# Altium schematic symbol library SCHLIB.SchLib: 2608 symbols (part 15 of 20)
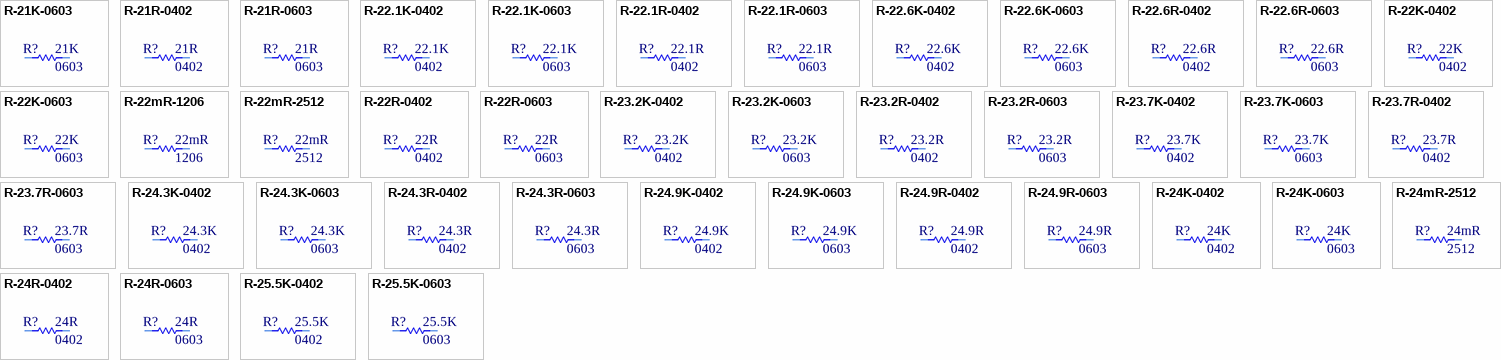
[diagram p97: symbols R-21K-0603 to R-25.5K-0603]

## R-22K-0603
designator R?, comment Package: 0603  (hidden comment: 22K)
RES SMD 22K OHM 1% 1/10W 0603; Manufacturer Part Number: CRCW060322K0FKEA; Manufacturer: Vishay Dale; Tolerance: 0.01; Power: 0.1W; Temperature Coefficient: ±100ppm/°C; Object  Type: Part; Design Item ID: R-22K-0603; Value: 22K; Composition: Thick Film; Features: Automotive AEC-Q200; Operating Temperature: -55°C ~ 155°C; Height - Seated (Max): 0.50mm; Category: Resistor
footprint R0603
pins: 1, 2

## R-22mR-1206
designator R?, comment Package: 1206  (hidden comment: 22mR)
RES 0.022 OHM 1% 1/4W 1206; Manufacturer Part Number: WSL1206R0220FEA; Manufacturer: Vishay Dale; Tolerance: 0.01; Power: 0.25W; Temperature Coefficient: ±75ppm/°C; Object  Type: Part; Design Item ID: R-22mR-1206; Value: 22mR; Composition: Metal Element; Features: Anti-Sulfur, Automotive AEC-Q200, Current Sense, Moisture Resistant, Pulse Withstanding; Operating Temperature: -65°C ~ 170°C; Height - Seated (Max): 0.89mm; Category: Resistor
footprint R1206
pins: 1, 2

## R-22mR-2512
designator R?, comment Package: 2512  (hidden comment: 22mR)
RES 0.022 OHM 1% 1W 2512; Manufacturer Part Number: WSL2512R0220FEA; Manufacturer: Vishay Dale; Tolerance: 0.01; Temperature Coefficient: ±75ppm/°C; Object  Type: Part; Design Item ID: R-22mR-2512; Value: 22mR; Power: 1W; Composition: Metal Element; Features: Anti-Sulfur, Automotive AEC-Q200, Current Sense, Moisture Resistant, Pulse Withstanding; Operating Temperature: -65°C ~ 170°C; Height - Seated (Max): 0.89mm; Category: Resistor
footprint R2512
pins: 1, 2

## R-22R-0402
designator R?, comment Package: 0402  (hidden comment: 22R)
RES 22 OHM 1% 1/16W 0402; Manufacturer Part Number: RC0402FR-0722RL; Manufacturer: YAGEO; Tolerance: 0.01; Power: 0.063W; Temperature Coefficient: ±100ppm/°C; Object  Type: Part; Design Item ID: R-22R-0402; Value: 22R; Composition: Thick Film; Features: Moisture Resistant; Operating Temperature: -55°C ~ 155°C; Height - Seated (Max): 0.40mm; Category: Resistor
footprint R0402
pins: 1, 2

## R-22R-0603
designator R?, comment Package: 0603  (hidden comment: 22R)
RES SMD 22 OHM 1% 1/10W 0603; Manufacturer Part Number: CRCW060322R0FKEA; Manufacturer: Vishay Dale; Tolerance: 0.01; Power: 0.1W; Temperature Coefficient: ±100ppm/°C; Object  Type: Part; Design Item ID: R-22R-0603; Value: 22R; Composition: Thick Film; Features: Automotive AEC-Q200; Operating Temperature: -55°C ~ 155°C; Height - Seated (Max): 0.50mm; Category: Resistor
footprint R0603
pins: 1, 2

## R-23.2K-0402
designator R?, comment Package: 0402  (hidden comment: 23.2K)
RES 23.2K OHM 1% 1/16W 0402; Manufacturer Part Number: RC0402FR-0723K2L; Manufacturer: YAGEO; Tolerance: 0.01; Power: 0.063W; Temperature Coefficient: ±100ppm/°C; Object  Type: Part; Design Item ID: R-23.2K-0402; Value: 23.2K; Composition: Thick Film; Features: Moisture Resistant; Operating Temperature: -55°C ~ 155°C; Height - Seated (Max): 0.40mm; Category: Resistor
footprint R0402
pins: 1, 2

## R-23.2K-0603
designator R?, comment Package: 0603  (hidden comment: 23.2K)
RES SMD 23.2K OHM 1% 1/10W 0603; Manufacturer Part Number: CRCW060323K2FKEA; Manufacturer: Vishay Dale; Tolerance: 0.01; Power: 0.1W; Temperature Coefficient: ±100ppm/°C; Object  Type: Part; Design Item ID: R-23.2K-0603; Value: 23.2K; Composition: Thick Film; Features: Automotive AEC-Q200; Operating Temperature: -55°C ~ 155°C; Height - Seated (Max): 0.50mm; Category: Resistor
footprint R0603
pins: 1, 2

## R-23.2R-0402
designator R?, comment Package: 0402  (hidden comment: 23.2R)
RES 23.2 OHM 1% 1/16W 0402; Manufacturer Part Number: RC0402FR-0723R2L; Manufacturer: YAGEO; Tolerance: 0.01; Power: 0.063W; Temperature Coefficient: ±100ppm/°C; Object  Type: Part; Design Item ID: R-23.2R-0402; Value: 23.2R; Composition: Thick Film; Features: Moisture Resistant; Operating Temperature: -55°C ~ 155°C; Height - Seated (Max): 0.40mm; Category: Resistor
footprint R0402
pins: 1, 2

## R-23.2R-0603
designator R?, comment Package: 0603  (hidden comment: 23.2R)
RES SMD 23.2 OHM 1% 1/10W 0603; Manufacturer Part Number: CRCW060323R2FKEA; Manufacturer: Vishay Dale; Tolerance: 0.01; Power: 0.1W; Temperature Coefficient: ±100ppm/°C; Object  Type: Part; Design Item ID: R-23.2R-0603; Value: 23.2R; Composition: Thick Film; Features: Automotive AEC-Q200; Operating Temperature: -55°C ~ 155°C; Height - Seated (Max): 0.50mm; Category: Resistor
footprint R0603
pins: 1, 2

## R-23.7K-0402
designator R?, comment Package: 0402  (hidden comment: 23.7K)
RES 23.7K OHM 1% 1/16W 0402; Manufacturer Part Number: RC0402FR-0723K7L; Manufacturer: YAGEO; Tolerance: 0.01; Power: 0.063W; Temperature Coefficient: ±100ppm/°C; Object  Type: Part; Design Item ID: R-23.7K-0402; Value: 23.7K; Composition: Thick Film; Features: Moisture Resistant; Operating Temperature: -55°C ~ 155°C; Height - Seated (Max): 0.40mm; Category: Resistor
footprint R0402
pins: 1, 2

## R-23.7K-0603
designator R?, comment Package: 0603  (hidden comment: 23.7K)
RES SMD 23.7K OHM 1% 1/10W 0603; Manufacturer Part Number: CRCW060323K7FKEA; Manufacturer: Vishay Dale; Tolerance: 0.01; Power: 0.1W; Temperature Coefficient: ±100ppm/°C; Object  Type: Part; Design Item ID: R-23.7K-0603; Value: 23.7K; Composition: Thick Film; Features: Automotive AEC-Q200; Operating Temperature: -55°C ~ 155°C; Height - Seated (Max): 0.50mm; Category: Resistor
footprint R0603
pins: 1, 2

## R-23.7R-0402
designator R?, comment Package: 0402  (hidden comment: 23.7R)
RES 23.7 OHM 1% 1/16W 0402; Manufacturer Part Number: RC0402FR-0723R7L; Manufacturer: YAGEO; Tolerance: 0.01; Power: 0.063W; Temperature Coefficient: ±100ppm/°C; Object  Type: Part; Design Item ID: R-23.7R-0402; Value: 23.7R; Composition: Thick Film; Features: Moisture Resistant; Operating Temperature: -55°C ~ 155°C; Height - Seated (Max): 0.40mm; Category: Resistor
footprint R0402
pins: 1, 2

## R-23.7R-0603
designator R?, comment Package: 0603  (hidden comment: 23.7R)
RES SMD 23.7 OHM 1% 1/10W 0603; Manufacturer Part Number: CRCW060323R7FKEA; Manufacturer: Vishay Dale; Tolerance: 0.01; Power: 0.1W; Temperature Coefficient: ±100ppm/°C; Object  Type: Part; Design Item ID: R-23.7R-0603; Value: 23.7R; Composition: Thick Film; Features: Automotive AEC-Q200; Operating Temperature: -55°C ~ 155°C; Height - Seated (Max): 0.50mm; Category: Resistor
footprint R0603
pins: 1, 2

## R-24.3K-0402
designator R?, comment Package: 0402  (hidden comment: 24.3K)
RES 24.3K OHM 1% 1/16W 0402; Manufacturer Part Number: RC0402FR-0724K3L; Manufacturer: YAGEO; Tolerance: 0.01; Power: 0.063W; Temperature Coefficient: ±100ppm/°C; Object  Type: Part; Design Item ID: R-24.3K-0402; Value: 24.3K; Composition: Thick Film; Features: Moisture Resistant; Operating Temperature: -55°C ~ 155°C; Height - Seated (Max): 0.40mm; Category: Resistor
footprint R0402
pins: 1, 2

## R-24.3K-0603
designator R?, comment Package: 0603  (hidden comment: 24.3K)
RES SMD 24.3K OHM 1% 1/10W 0603; Manufacturer Part Number: CRCW060324K3FKEA; Manufacturer: Vishay Dale; Tolerance: 0.01; Power: 0.1W; Temperature Coefficient: ±100ppm/°C; Object  Type: Part; Design Item ID: R-24.3K-0603; Value: 24.3K; Composition: Thick Film; Features: Automotive AEC-Q200; Operating Temperature: -55°C ~ 155°C; Height - Seated (Max): 0.50mm; Category: Resistor
footprint R0603
pins: 1, 2

## R-24.3R-0402
designator R?, comment Package: 0402  (hidden comment: 24.3R)
RES 24.3 OHM 1% 1/16W 0402; Manufacturer Part Number: RC0402FR-0724R3L; Manufacturer: YAGEO; Tolerance: 0.01; Power: 0.063W; Temperature Coefficient: ±100ppm/°C; Object  Type: Part; Design Item ID: R-24.3R-0402; Value: 24.3R; Composition: Thick Film; Features: Moisture Resistant; Operating Temperature: -55°C ~ 155°C; Height - Seated (Max): 0.40mm; Category: Resistor
footprint R0402
pins: 1, 2

## R-24.3R-0603
designator R?, comment Package: 0603  (hidden comment: 24.3R)
RES SMD 24.3 OHM 1% 1/10W 0603; Manufacturer Part Number: CRCW060324R3FKEA; Manufacturer: Vishay Dale; Tolerance: 0.01; Power: 0.1W; Temperature Coefficient: ±100ppm/°C; Object  Type: Part; Design Item ID: R-24.3R-0603; Value: 24.3R; Composition: Thick Film; Features: Automotive AEC-Q200; Operating Temperature: -55°C ~ 155°C; Height - Seated (Max): 0.50mm; Category: Resistor
footprint R0603
pins: 1, 2

## R-24.9K-0402
designator R?, comment Package: 0402  (hidden comment: 24.9K)
RES 24.9K OHM 1% 1/16W 0402; Manufacturer Part Number: RC0402FR-0724K9L; Manufacturer: YAGEO; Tolerance: 0.01; Power: 0.063W; Temperature Coefficient: ±100ppm/°C; Object  Type: Part; Design Item ID: R-24.9K-0402; Value: 24.9K; Composition: Thick Film; Features: Moisture Resistant; Operating Temperature: -55°C ~ 155°C; Height - Seated (Max): 0.40mm; Category: Resistor
footprint R0402
pins: 1, 2

## R-24.9K-0603
designator R?, comment Package: 0603  (hidden comment: 24.9K)
RES SMD 24.9K OHM 1% 1/10W 0603; Manufacturer Part Number: CRCW060324K9FKEA; Manufacturer: Vishay Dale; Tolerance: 0.01; Power: 0.1W; Temperature Coefficient: ±100ppm/°C; Object  Type: Part; Design Item ID: R-24.9K-0603; Value: 24.9K; Composition: Thick Film; Features: Automotive AEC-Q200; Operating Temperature: -55°C ~ 155°C; Height - Seated (Max): 0.50mm; Category: Resistor
footprint R0603
pins: 1, 2

## R-24.9R-0402
designator R?, comment Package: 0402  (hidden comment: 24.9R)
RES 24.9 OHM 1% 1/16W 0402; Manufacturer Part Number: RC0402FR-0724R9L; Manufacturer: YAGEO; Tolerance: 0.01; Power: 0.063W; Temperature Coefficient: ±100ppm/°C; Object  Type: Part; Design Item ID: R-24.9R-0402; Value: 24.9R; Composition: Thick Film; Features: Moisture Resistant; Operating Temperature: -55°C ~ 155°C; Height - Seated (Max): 0.40mm; Category: Resistor
footprint R0402
pins: 1, 2

## R-24.9R-0603
designator R?, comment Package: 0603  (hidden comment: 24.9R)
RES SMD 24.9 OHM 1% 1/10W 0603; Manufacturer Part Number: CRCW060324R9FKEA; Manufacturer: Vishay Dale; Tolerance: 0.01; Power: 0.1W; Temperature Coefficient: ±100ppm/°C; Object  Type: Part; Design Item ID: R-24.9R-0603; Value: 24.9R; Composition: Thick Film; Features: Automotive AEC-Q200; Operating Temperature: -55°C ~ 155°C; Height - Seated (Max): 0.50mm; Category: Resistor
footprint R0603
pins: 1, 2

## R-24K-0402
designator R?, comment Package: 0402  (hidden comment: 24K)
RES 24K OHM 1% 1/16W 0402; Manufacturer Part Number: RC0402FR-0724KL; Manufacturer: YAGEO; Tolerance: 0.01; Power: 0.063W; Temperature Coefficient: ±100ppm/°C; Object  Type: Part; Design Item ID: R-24K-0402; Value: 24K; Composition: Thick Film; Features: Moisture Resistant; Operating Temperature: -55°C ~ 155°C; Height - Seated (Max): 0.40mm; Category: Resistor
footprint R0402
pins: 1, 2

## R-24K-0603
designator R?, comment Package: 0603  (hidden comment: 24K)
RES SMD 24K OHM 1% 1/10W 0603; Manufacturer Part Number: CRCW060324K0FKEA; Manufacturer: Vishay Dale; Tolerance: 0.01; Power: 0.1W; Temperature Coefficient: ±100ppm/°C; Object  Type: Part; Design Item ID: R-24K-0603; Value: 24K; Composition: Thick Film; Features: Automotive AEC-Q200; Operating Temperature: -55°C ~ 155°C; Height - Seated (Max): 0.50mm; Category: Resistor
footprint R0603
pins: 1, 2

## R-24mR-2512
designator R?, comment Package: 2512  (hidden comment: 24mR)
RES 0.024 OHM 1% 1W 2512; Manufacturer Part Number: WSL2512R0240FEA; Manufacturer: Vishay Dale; Tolerance: 0.01; Temperature Coefficient: ±75ppm/°C; Object  Type: Part; Design Item ID: R-24mR-2512; Value: 24mR; Power: 1W; Composition: Metal Element; Features: Anti-Sulfur, Automotive AEC-Q200, Current Sense, Moisture Resistant, Pulse Withstanding; Operating Temperature: -65°C ~ 170°C; Height - Seated (Max): 0.89mm; Category: Resistor
footprint R2512
pins: 1, 2

## R-24R-0402
designator R?, comment Package: 0402  (hidden comment: 24R)
RES 24 OHM 1% 1/16W 0402; Manufacturer Part Number: RC0402FR-0724RL; Manufacturer: YAGEO; Tolerance: 0.01; Power: 0.063W; Temperature Coefficient: ±100ppm/°C; Object  Type: Part; Design Item ID: R-24R-0402; Value: 24R; Composition: Thick Film; Features: Moisture Resistant; Operating Temperature: -55°C ~ 155°C; Height - Seated (Max): 0.40mm; Category: Resistor
footprint R0402
pins: 1, 2

## R-24R-0603
designator R?, comment Package: 0603  (hidden comment: 24R)
RES SMD 24 OHM 1% 1/10W 0603; Manufacturer Part Number: CRCW060324R0FKEA; Manufacturer: Vishay Dale; Tolerance: 0.01; Power: 0.1W; Temperature Coefficient: ±100ppm/°C; Object  Type: Part; Design Item ID: R-24R-0603; Value: 24R; Composition: Thick Film; Features: Automotive AEC-Q200; Operating Temperature: -55°C ~ 155°C; Height - Seated (Max): 0.50mm; Category: Resistor
footprint R0603
pins: 1, 2

## R-25.5K-0402
designator R?, comment Package: 0402  (hidden comment: 25.5K)
RES 25.5K OHM 1% 1/16W 0402; Manufacturer Part Number: RC0402FR-0725K5L; Manufacturer: YAGEO; Tolerance: 0.01; Power: 0.063W; Temperature Coefficient: ±100ppm/°C; Object  Type: Part; Design Item ID: R-25.5K-0402; Value: 25.5K; Composition: Thick Film; Features: Moisture Resistant; Operating Temperature: -55°C ~ 155°C; Height - Seated (Max): 0.40mm; Category: Resistor
footprint R0402
pins: 1, 2

## R-25.5K-0603
designator R?, comment Package: 0603  (hidden comment: 25.5K)
RES SMD 25.5K OHM 1% 1/10W 0603; Manufacturer Part Number: CRCW060325K5FKEA; Manufacturer: Vishay Dale; Tolerance: 0.01; Power: 0.1W; Temperature Coefficient: ±100ppm/°C; Object  Type: Part; Design Item ID: R-25.5K-0603; Value: 25.5K; Composition: Thick Film; Features: Automotive AEC-Q200; Operating Temperature: -55°C ~ 155°C; Height - Seated (Max): 0.50mm; Category: Resistor
footprint R0603
pins: 1, 2

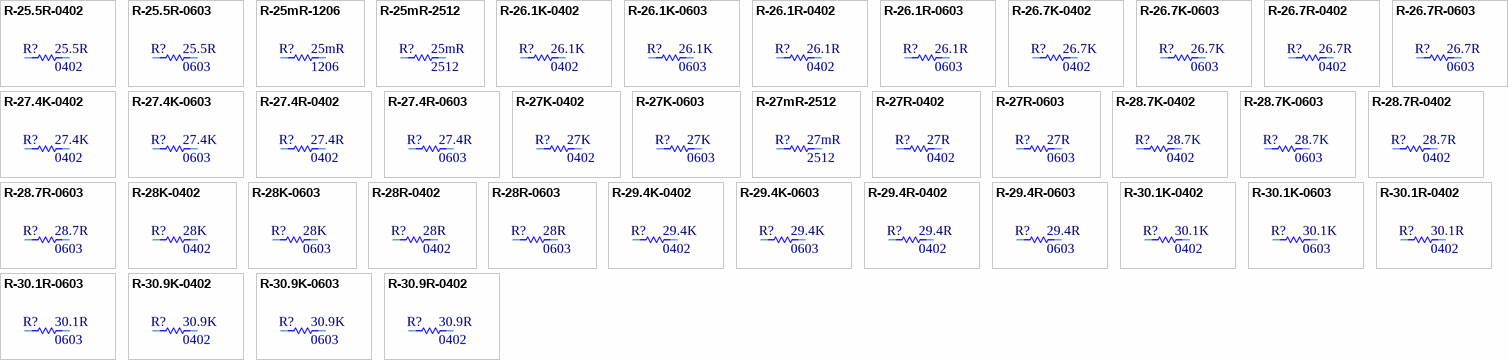
[diagram p62: symbols R-25.5R-0402 to R-30.9R-0402]

## R-25.5R-0402
designator R?, comment Package: 0402  (hidden comment: 25.5R)
RES 25.5 OHM 1% 1/16W 0402; Manufacturer Part Number: RC0402FR-0725R5L; Manufacturer: YAGEO; Tolerance: 0.01; Power: 0.063W; Temperature Coefficient: ±100ppm/°C; Object  Type: Part; Design Item ID: R-25.5R-0402; Value: 25.5R; Composition: Thick Film; Features: Moisture Resistant; Operating Temperature: -55°C ~ 155°C; Height - Seated (Max): 0.40mm; Category: Resistor
footprint R0402
pins: 1, 2

## R-25.5R-0603
designator R?, comment Package: 0603  (hidden comment: 25.5R)
RES SMD 25.5 OHM 1% 1/10W 0603; Manufacturer Part Number: CRCW060325R5FKEA; Manufacturer: Vishay Dale; Tolerance: 0.01; Power: 0.1W; Temperature Coefficient: ±100ppm/°C; Object  Type: Part; Design Item ID: R-25.5R-0603; Value: 25.5R; Composition: Thick Film; Features: Automotive AEC-Q200; Operating Temperature: -55°C ~ 155°C; Height - Seated (Max): 0.50mm; Category: Resistor
footprint R0603
pins: 1, 2

## R-25mR-1206
designator R?, comment Package: 1206  (hidden comment: 25mR)
RES 0.025 OHM 1% 1/4W 1206; Manufacturer Part Number: WSL1206R0250FEA; Manufacturer: Vishay Dale; Tolerance: 0.01; Power: 0.25W; Temperature Coefficient: ±75ppm/°C; Object  Type: Part; Design Item ID: R-25mR-1206; Value: 25mR; Composition: Metal Element; Features: Anti-Sulfur, Automotive AEC-Q200, Current Sense, Moisture Resistant, Pulse Withstanding; Operating Temperature: -65°C ~ 170°C; Height - Seated (Max): 0.89mm; Category: Resistor
footprint R1206
pins: 1, 2

## R-25mR-2512
designator R?, comment Package: 2512  (hidden comment: 25mR)
RES 0.025 OHM 1% 1W 2512; Manufacturer Part Number: WSL2512R0250FEA; Manufacturer: Vishay Dale; Tolerance: 0.01; Temperature Coefficient: ±75ppm/°C; Object  Type: Part; Design Item ID: R-25mR-2512; Value: 25mR; Power: 1W; Composition: Metal Element; Features: Anti-Sulfur, Automotive AEC-Q200, Current Sense, Moisture Resistant, Pulse Withstanding; Operating Temperature: -65°C ~ 170°C; Height - Seated (Max): 0.89mm; Category: Resistor
footprint R2512
pins: 1, 2

## R-26.1K-0402
designator R?, comment Package: 0402  (hidden comment: 26.1K)
RES 26.1K OHM 1% 1/16W 0402; Manufacturer Part Number: RC0402FR-0726K1L; Manufacturer: YAGEO; Tolerance: 0.01; Power: 0.063W; Temperature Coefficient: ±100ppm/°C; Object  Type: Part; Design Item ID: R-26.1K-0402; Value: 26.1K; Composition: Thick Film; Features: Moisture Resistant; Operating Temperature: -55°C ~ 155°C; Height - Seated (Max): 0.40mm; Category: Resistor
footprint R0402
pins: 1, 2

## R-26.1K-0603
designator R?, comment Package: 0603  (hidden comment: 26.1K)
RES SMD 26.1K OHM 1% 1/10W 0603; Manufacturer Part Number: CRCW060326K1FKEA; Manufacturer: Vishay Dale; Tolerance: 0.01; Power: 0.1W; Temperature Coefficient: ±100ppm/°C; Object  Type: Part; Design Item ID: R-26.1K-0603; Value: 26.1K; Composition: Thick Film; Features: Automotive AEC-Q200; Operating Temperature: -55°C ~ 155°C; Height - Seated (Max): 0.50mm; Category: Resistor
footprint R0603
pins: 1, 2

## R-26.1R-0402
designator R?, comment Package: 0402  (hidden comment: 26.1R)
RES 26.1 OHM 1% 1/16W 0402; Manufacturer Part Number: RC0402FR-0726R1L; Manufacturer: YAGEO; Tolerance: 0.01; Power: 0.063W; Temperature Coefficient: ±100ppm/°C; Object  Type: Part; Design Item ID: R-26.1R-0402; Value: 26.1R; Composition: Thick Film; Features: Moisture Resistant; Operating Temperature: -55°C ~ 155°C; Height - Seated (Max): 0.40mm; Category: Resistor
footprint R0402
pins: 1, 2

## R-26.1R-0603
designator R?, comment Package: 0603  (hidden comment: 26.1R)
RES SMD 26.1 OHM 1% 1/10W 0603; Manufacturer Part Number: CRCW060326R1FKEA; Manufacturer: Vishay Dale; Tolerance: 0.01; Power: 0.1W; Temperature Coefficient: ±100ppm/°C; Object  Type: Part; Design Item ID: R-26.1R-0603; Value: 26.1R; Composition: Thick Film; Features: Automotive AEC-Q200; Operating Temperature: -55°C ~ 155°C; Height - Seated (Max): 0.50mm; Category: Resistor
footprint R0603
pins: 1, 2

## R-26.7K-0402
designator R?, comment Package: 0402  (hidden comment: 26.7K)
RES 26.7K OHM 1% 1/16W 0402; Manufacturer Part Number: RC0402FR-0726K7L; Manufacturer: YAGEO; Tolerance: 0.01; Power: 0.063W; Temperature Coefficient: ±100ppm/°C; Object  Type: Part; Design Item ID: R-26.7K-0402; Value: 26.7K; Composition: Thick Film; Features: Moisture Resistant; Operating Temperature: -55°C ~ 155°C; Height - Seated (Max): 0.40mm; Category: Resistor
footprint R0402
pins: 1, 2

## R-26.7K-0603
designator R?, comment Package: 0603  (hidden comment: 26.7K)
RES SMD 26.7K OHM 1% 1/10W 0603; Manufacturer Part Number: CRCW060326K7FKEA; Manufacturer: Vishay Dale; Tolerance: 0.01; Power: 0.1W; Temperature Coefficient: ±100ppm/°C; Object  Type: Part; Design Item ID: R-26.7K-0603; Value: 26.7K; Composition: Thick Film; Features: Automotive AEC-Q200; Operating Temperature: -55°C ~ 155°C; Height - Seated (Max): 0.50mm; Category: Resistor
footprint R0603
pins: 1, 2

## R-26.7R-0402
designator R?, comment Package: 0402  (hidden comment: 26.7R)
RES 26.7 OHM 1% 1/16W 0402; Manufacturer Part Number: RC0402FR-0726R7L; Manufacturer: YAGEO; Tolerance: 0.01; Power: 0.063W; Temperature Coefficient: ±100ppm/°C; Object  Type: Part; Design Item ID: R-26.7R-0402; Value: 26.7R; Composition: Thick Film; Features: Moisture Resistant; Operating Temperature: -55°C ~ 155°C; Height - Seated (Max): 0.40mm; Category: Resistor
footprint R0402
pins: 1, 2

## R-26.7R-0603
designator R?, comment Package: 0603  (hidden comment: 26.7R)
RES SMD 26.7 OHM 1% 1/10W 0603; Manufacturer Part Number: CRCW060326R7FKEA; Manufacturer: Vishay Dale; Tolerance: 0.01; Power: 0.1W; Temperature Coefficient: ±100ppm/°C; Object  Type: Part; Design Item ID: R-26.7R-0603; Value: 26.7R; Composition: Thick Film; Features: Automotive AEC-Q200; Operating Temperature: -55°C ~ 155°C; Height - Seated (Max): 0.50mm; Category: Resistor
footprint R0603
pins: 1, 2

## R-27.4K-0402
designator R?, comment Package: 0402  (hidden comment: 27.4K)
RES 27.4K OHM 1% 1/16W 0402; Manufacturer Part Number: RC0402FR-0727K4L; Manufacturer: YAGEO; Tolerance: 0.01; Power: 0.063W; Temperature Coefficient: ±100ppm/°C; Object  Type: Part; Design Item ID: R-27.4K-0402; Value: 27.4K; Composition: Thick Film; Features: Moisture Resistant; Operating Temperature: -55°C ~ 155°C; Height - Seated (Max): 0.40mm; Category: Resistor
footprint R0402
pins: 1, 2

## R-27.4K-0603
designator R?, comment Package: 0603  (hidden comment: 27.4K)
RES SMD 27.4K OHM 1% 1/10W 0603; Manufacturer Part Number: CRCW060327K4FKEA; Manufacturer: Vishay Dale; Tolerance: 0.01; Power: 0.1W; Temperature Coefficient: ±100ppm/°C; Object  Type: Part; Design Item ID: R-27.4K-0603; Value: 27.4K; Composition: Thick Film; Features: Automotive AEC-Q200; Operating Temperature: -55°C ~ 155°C; Height - Seated (Max): 0.50mm; Category: Resistor
footprint R0603
pins: 1, 2

## R-27.4R-0402
designator R?, comment Package: 0402  (hidden comment: 27.4R)
RES 27.4 OHM 1% 1/16W 0402; Manufacturer Part Number: RC0402FR-0727R4L; Manufacturer: YAGEO; Tolerance: 0.01; Power: 0.063W; Temperature Coefficient: ±100ppm/°C; Object  Type: Part; Design Item ID: R-27.4R-0402; Value: 27.4R; Composition: Thick Film; Features: Moisture Resistant; Operating Temperature: -55°C ~ 155°C; Height - Seated (Max): 0.40mm; Category: Resistor
footprint R0402
pins: 1, 2

## R-27.4R-0603
designator R?, comment Package: 0603  (hidden comment: 27.4R)
RES SMD 27.4 OHM 1% 1/10W 0603; Manufacturer Part Number: CRCW060327R4FKEA; Manufacturer: Vishay Dale; Tolerance: 0.01; Power: 0.1W; Temperature Coefficient: ±100ppm/°C; Object  Type: Part; Design Item ID: R-27.4R-0603; Value: 27.4R; Composition: Thick Film; Features: Automotive AEC-Q200; Operating Temperature: -55°C ~ 155°C; Height - Seated (Max): 0.50mm; Category: Resistor
footprint R0603
pins: 1, 2

## R-27K-0402
designator R?, comment Package: 0402  (hidden comment: 27K)
RES 27K OHM 1% 1/16W 0402; Manufacturer Part Number: RC0402FR-0727KL; Manufacturer: YAGEO; Tolerance: 0.01; Power: 0.063W; Temperature Coefficient: ±100ppm/°C; Object  Type: Part; Design Item ID: R-27K-0402; Value: 27K; Composition: Thick Film; Features: Moisture Resistant; Operating Temperature: -55°C ~ 155°C; Height - Seated (Max): 0.40mm; Category: Resistor
footprint R0402
pins: 1, 2

## R-27K-0603
designator R?, comment Package: 0603  (hidden comment: 27K)
RES SMD 27K OHM 1% 1/10W 0603; Manufacturer Part Number: CRCW060327K0FKEA; Manufacturer: Vishay Dale; Tolerance: 0.01; Power: 0.1W; Temperature Coefficient: ±100ppm/°C; Object  Type: Part; Design Item ID: R-27K-0603; Value: 27K; Composition: Thick Film; Features: Automotive AEC-Q200; Operating Temperature: -55°C ~ 155°C; Height - Seated (Max): 0.50mm; Category: Resistor
footprint R0603
pins: 1, 2

## R-27mR-2512
designator R?, comment Package: 2512  (hidden comment: 27mR)
RES 0.027 OHM 1% 1W 2512; Manufacturer Part Number: WSL2512R0270FEA; Manufacturer: Vishay Dale; Tolerance: 0.01; Temperature Coefficient: ±75ppm/°C; Object  Type: Part; Design Item ID: R-27mR-2512; Value: 27mR; Power: 1W; Composition: Metal Element; Features: Anti-Sulfur, Automotive AEC-Q200, Current Sense, Moisture Resistant, Pulse Withstanding; Operating Temperature: -65°C ~ 170°C; Height - Seated (Max): 0.89mm; Category: Resistor
footprint R2512
pins: 1, 2

## R-27R-0402
designator R?, comment Package: 0402  (hidden comment: 27R)
RES 27 OHM 1% 1/16W 0402; Manufacturer Part Number: RC0402FR-0727RL; Manufacturer: YAGEO; Tolerance: 0.01; Power: 0.063W; Temperature Coefficient: ±100ppm/°C; Object  Type: Part; Design Item ID: R-27R-0402; Value: 27R; Composition: Thick Film; Features: Moisture Resistant; Operating Temperature: -55°C ~ 155°C; Height - Seated (Max): 0.40mm; Category: Resistor
footprint R0402
pins: 1, 2

## R-27R-0603
designator R?, comment Package: 0603  (hidden comment: 27R)
RES SMD 27 OHM 1% 1/10W 0603; Manufacturer Part Number: CRCW060327R0FKEA; Manufacturer: Vishay Dale; Tolerance: 0.01; Power: 0.1W; Temperature Coefficient: ±100ppm/°C; Object  Type: Part; Design Item ID: R-27R-0603; Value: 27R; Composition: Thick Film; Features: Automotive AEC-Q200; Operating Temperature: -55°C ~ 155°C; Height - Seated (Max): 0.50mm; Category: Resistor
footprint R0603
pins: 1, 2

## R-28.7K-0402
designator R?, comment Package: 0402  (hidden comment: 28.7K)
RES 28.7K OHM 1% 1/16W 0402; Manufacturer Part Number: RC0402FR-0728K7L; Manufacturer: YAGEO; Tolerance: 0.01; Power: 0.063W; Temperature Coefficient: ±100ppm/°C; Object  Type: Part; Design Item ID: R-28.7K-0402; Value: 28.7K; Composition: Thick Film; Features: Moisture Resistant; Operating Temperature: -55°C ~ 155°C; Height - Seated (Max): 0.40mm; Category: Resistor
footprint R0402
pins: 1, 2

## R-28.7K-0603
designator R?, comment Package: 0603  (hidden comment: 28.7K)
RES SMD 28.7K OHM 1% 1/10W 0603; Manufacturer Part Number: CRCW060328K7FKEA; Manufacturer: Vishay Dale; Tolerance: 0.01; Power: 0.1W; Temperature Coefficient: ±100ppm/°C; Object  Type: Part; Design Item ID: R-28.7K-0603; Value: 28.7K; Composition: Thick Film; Features: Automotive AEC-Q200; Operating Temperature: -55°C ~ 155°C; Height - Seated (Max): 0.50mm; Category: Resistor
footprint R0603
pins: 1, 2

## R-28.7R-0402
designator R?, comment Package: 0402  (hidden comment: 28.7R)
RES 28.7 OHM 1% 1/16W 0402; Manufacturer Part Number: RC0402FR-0728R7L; Manufacturer: YAGEO; Tolerance: 0.01; Power: 0.063W; Temperature Coefficient: ±100ppm/°C; Object  Type: Part; Design Item ID: R-28.7R-0402; Value: 28.7R; Composition: Thick Film; Features: Moisture Resistant; Operating Temperature: -55°C ~ 155°C; Height - Seated (Max): 0.40mm; Category: Resistor
footprint R0402
pins: 1, 2

## R-28.7R-0603
designator R?, comment Package: 0603  (hidden comment: 28.7R)
RES SMD 28.7 OHM 1% 1/10W 0603; Manufacturer Part Number: CRCW060328R7FKEA; Manufacturer: Vishay Dale; Tolerance: 0.01; Power: 0.1W; Temperature Coefficient: ±100ppm/°C; Object  Type: Part; Design Item ID: R-28.7R-0603; Value: 28.7R; Composition: Thick Film; Features: Automotive AEC-Q200; Operating Temperature: -55°C ~ 155°C; Height - Seated (Max): 0.50mm; Category: Resistor
footprint R0603
pins: 1, 2

## R-28K-0402
designator R?, comment Package: 0402  (hidden comment: 28K)
RES 28K OHM 1% 1/16W 0402; Manufacturer Part Number: RC0402FR-0728KL; Manufacturer: YAGEO; Tolerance: 0.01; Power: 0.063W; Temperature Coefficient: ±100ppm/°C; Object  Type: Part; Design Item ID: R-28K-0402; Value: 28K; Composition: Thick Film; Features: Moisture Resistant; Operating Temperature: -55°C ~ 155°C; Height - Seated (Max): 0.40mm; Category: Resistor
footprint R0402
pins: 1, 2

## R-28K-0603
designator R?, comment Package: 0603  (hidden comment: 28K)
RES SMD 28K OHM 1% 1/10W 0603; Manufacturer Part Number: CRCW060328K0FKEA; Manufacturer: Vishay Dale; Tolerance: 0.01; Power: 0.1W; Temperature Coefficient: ±100ppm/°C; Object  Type: Part; Design Item ID: R-28K-0603; Value: 28K; Composition: Thick Film; Features: Automotive AEC-Q200; Operating Temperature: -55°C ~ 155°C; Height - Seated (Max): 0.50mm; Category: Resistor
footprint R0603
pins: 1, 2

## R-28R-0402
designator R?, comment Package: 0402  (hidden comment: 28R)
RES 28 OHM 1% 1/16W 0402; Manufacturer Part Number: RC0402FR-0728RL; Manufacturer: YAGEO; Tolerance: 0.01; Power: 0.063W; Temperature Coefficient: ±100ppm/°C; Object  Type: Part; Design Item ID: R-28R-0402; Value: 28R; Composition: Thick Film; Features: Moisture Resistant; Operating Temperature: -55°C ~ 155°C; Height - Seated (Max): 0.40mm; Category: Resistor
footprint R0402
pins: 1, 2

## R-28R-0603
designator R?, comment Package: 0603  (hidden comment: 28R)
RES SMD 28 OHM 1% 1/10W 0603; Manufacturer Part Number: CRCW060328R0FKEA; Manufacturer: Vishay Dale; Tolerance: 0.01; Power: 0.1W; Temperature Coefficient: ±100ppm/°C; Object  Type: Part; Design Item ID: R-28R-0603; Value: 28R; Composition: Thick Film; Features: Automotive AEC-Q200; Operating Temperature: -55°C ~ 155°C; Height - Seated (Max): 0.50mm; Category: Resistor
footprint R0603
pins: 1, 2

## R-29.4K-0402
designator R?, comment Package: 0402  (hidden comment: 29.4K)
RES 29.4K OHM 1% 1/16W 0402; Manufacturer Part Number: RC0402FR-0729K4L; Manufacturer: YAGEO; Tolerance: 0.01; Power: 0.063W; Temperature Coefficient: ±100ppm/°C; Object  Type: Part; Design Item ID: R-29.4K-0402; Value: 29.4K; Composition: Thick Film; Features: Moisture Resistant; Operating Temperature: -55°C ~ 155°C; Height - Seated (Max): 0.40mm; Category: Resistor
footprint R0402
pins: 1, 2

## R-29.4K-0603
designator R?, comment Package: 0603  (hidden comment: 29.4K)
RES SMD 29.4K OHM 1% 1/10W 0603; Manufacturer Part Number: CRCW060329K4FKEA; Manufacturer: Vishay Dale; Tolerance: 0.01; Power: 0.1W; Temperature Coefficient: ±100ppm/°C; Object  Type: Part; Design Item ID: R-29.4K-0603; Value: 29.4K; Composition: Thick Film; Features: Automotive AEC-Q200; Operating Temperature: -55°C ~ 155°C; Height - Seated (Max): 0.50mm; Category: Resistor
footprint R0603
pins: 1, 2

## R-29.4R-0402
designator R?, comment Package: 0402  (hidden comment: 29.4R)
RES 29.4 OHM 1% 1/16W 0402; Manufacturer Part Number: RC0402FR-0729R4L; Manufacturer: YAGEO; Tolerance: 0.01; Power: 0.063W; Temperature Coefficient: ±100ppm/°C; Object  Type: Part; Design Item ID: R-29.4R-0402; Value: 29.4R; Composition: Thick Film; Features: Moisture Resistant; Operating Temperature: -55°C ~ 155°C; Height - Seated (Max): 0.40mm; Category: Resistor
footprint R0402
pins: 1, 2

## R-29.4R-0603
designator R?, comment Package: 0603  (hidden comment: 29.4R)
RES SMD 29.4 OHM 1% 1/10W 0603; Manufacturer Part Number: CRCW060329R4FKEA; Manufacturer: Vishay Dale; Tolerance: 0.01; Power: 0.1W; Temperature Coefficient: ±100ppm/°C; Object  Type: Part; Design Item ID: R-29.4R-0603; Value: 29.4R; Composition: Thick Film; Features: Automotive AEC-Q200; Operating Temperature: -55°C ~ 155°C; Height - Seated (Max): 0.50mm; Category: Resistor
footprint R0603
pins: 1, 2

## R-30.1K-0402
designator R?, comment Package: 0402  (hidden comment: 30.1K)
RES 30.1K OHM 1% 1/16W 0402; Manufacturer Part Number: RC0402FR-0730K1L; Manufacturer: YAGEO; Tolerance: 0.01; Power: 0.063W; Temperature Coefficient: ±100ppm/°C; Object  Type: Part; Design Item ID: R-30.1K-0402; Value: 30.1K; Composition: Thick Film; Features: Moisture Resistant; Operating Temperature: -55°C ~ 155°C; Height - Seated (Max): 0.40mm; Category: Resistor
footprint R0402
pins: 1, 2

## R-30.1K-0603
designator R?, comment Package: 0603  (hidden comment: 30.1K)
RES SMD 30.1K OHM 1% 1/10W 0603; Manufacturer Part Number: CRCW060330K1FKEA; Manufacturer: Vishay Dale; Tolerance: 0.01; Power: 0.1W; Temperature Coefficient: ±100ppm/°C; Object  Type: Part; Design Item ID: R-30.1K-0603; Value: 30.1K; Composition: Thick Film; Features: Automotive AEC-Q200; Operating Temperature: -55°C ~ 155°C; Height - Seated (Max): 0.50mm; Category: Resistor
footprint R0603
pins: 1, 2

## R-30.1R-0402
designator R?, comment Package: 0402  (hidden comment: 30.1R)
RES 30.1 OHM 1% 1/16W 0402; Manufacturer Part Number: RC0402FR-0730R1L; Manufacturer: YAGEO; Tolerance: 0.01; Power: 0.063W; Temperature Coefficient: ±100ppm/°C; Object  Type: Part; Design Item ID: R-30.1R-0402; Value: 30.1R; Composition: Thick Film; Features: Moisture Resistant; Operating Temperature: -55°C ~ 155°C; Height - Seated (Max): 0.40mm; Category: Resistor
footprint R0402
pins: 1, 2

## R-30.1R-0603
designator R?, comment Package: 0603  (hidden comment: 30.1R)
RES SMD 30.1 OHM 1% 1/10W 0603; Manufacturer Part Number: CRCW060330R1FKEA; Manufacturer: Vishay Dale; Tolerance: 0.01; Power: 0.1W; Temperature Coefficient: ±100ppm/°C; Object  Type: Part; Design Item ID: R-30.1R-0603; Value: 30.1R; Composition: Thick Film; Features: Automotive AEC-Q200; Operating Temperature: -55°C ~ 155°C; Height - Seated (Max): 0.50mm; Category: Resistor
footprint R0603
pins: 1, 2

## R-30.9K-0402
designator R?, comment Package: 0402  (hidden comment: 30.9K)
RES 30.9K OHM 1% 1/16W 0402; Manufacturer Part Number: RC0402FR-0730K9L; Manufacturer: YAGEO; Tolerance: 0.01; Power: 0.063W; Temperature Coefficient: ±100ppm/°C; Object  Type: Part; Design Item ID: R-30.9K-0402; Value: 30.9K; Composition: Thick Film; Features: Moisture Resistant; Operating Temperature: -55°C ~ 155°C; Height - Seated (Max): 0.40mm; Category: Resistor
footprint R0402
pins: 1, 2

## R-30.9K-0603
designator R?, comment Package: 0603  (hidden comment: 30.9K)
RES SMD 30.9K OHM 1% 1/10W 0603; Manufacturer Part Number: CRCW060330K9FKEA; Manufacturer: Vishay Dale; Tolerance: 0.01; Power: 0.1W; Temperature Coefficient: ±100ppm/°C; Object  Type: Part; Design Item ID: R-30.9K-0603; Value: 30.9K; Composition: Thick Film; Features: Automotive AEC-Q200; Operating Temperature: -55°C ~ 155°C; Height - Seated (Max): 0.50mm; Category: Resistor
footprint R0603
pins: 1, 2

## R-30.9R-0402
designator R?, comment Package: 0402  (hidden comment: 30.9R)
RES 30.9 OHM 1% 1/16W 0402; Manufacturer Part Number: RC0402FR-0730R9L; Manufacturer: YAGEO; Tolerance: 0.01; Power: 0.063W; Temperature Coefficient: ±100ppm/°C; Object  Type: Part; Design Item ID: R-30.9R-0402; Value: 30.9R; Composition: Thick Film; Features: Moisture Resistant; Operating Temperature: -55°C ~ 155°C; Height - Seated (Max): 0.40mm; Category: Resistor
footprint R0402
pins: 1, 2

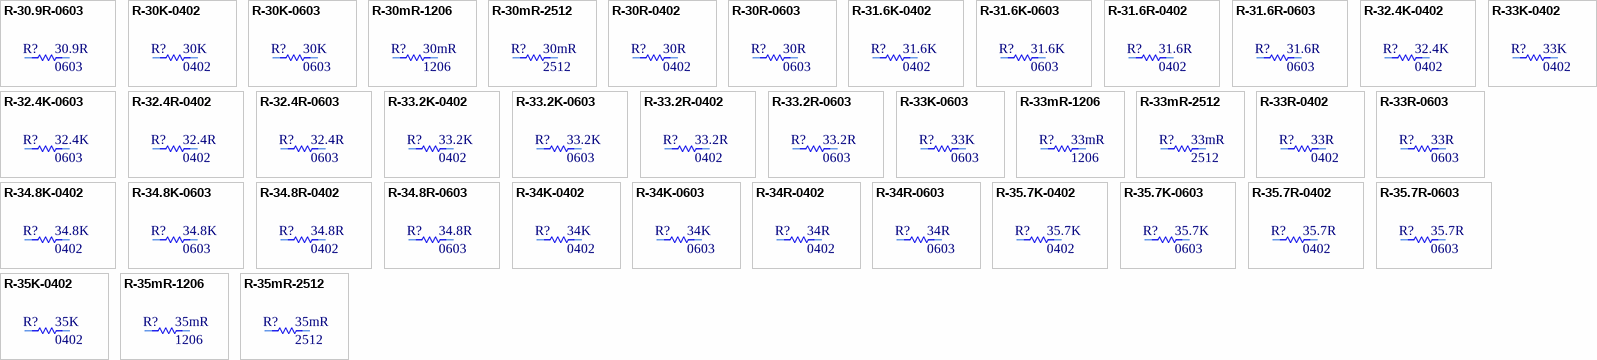
[diagram p63: symbols R-30.9R-0603 to R-35mR-2512]

## R-30.9R-0603
designator R?, comment Package: 0603  (hidden comment: 30.9R)
RES SMD 30.9 OHM 1% 1/10W 0603; Manufacturer Part Number: CRCW060330R9FKEA; Manufacturer: Vishay Dale; Tolerance: 0.01; Power: 0.1W; Temperature Coefficient: ±100ppm/°C; Object  Type: Part; Design Item ID: R-30.9R-0603; Value: 30.9R; Composition: Thick Film; Features: Automotive AEC-Q200; Operating Temperature: -55°C ~ 155°C; Height - Seated (Max): 0.50mm; Category: Resistor
footprint R0603
pins: 1, 2

## R-30K-0402
designator R?, comment Package: 0402  (hidden comment: 30K)
RES 30K OHM 1% 1/16W 0402; Manufacturer Part Number: RC0402FR-0730KL; Manufacturer: YAGEO; Tolerance: 0.01; Power: 0.063W; Temperature Coefficient: ±100ppm/°C; Object  Type: Part; Design Item ID: R-30K-0402; Value: 30K; Composition: Thick Film; Features: Moisture Resistant; Operating Temperature: -55°C ~ 155°C; Height - Seated (Max): 0.40mm; Category: Resistor
footprint R0402
pins: 1, 2

## R-30K-0603
designator R?, comment Package: 0603  (hidden comment: 30K)
RES SMD 30K OHM 1% 1/10W 0603; Manufacturer Part Number: CRCW060330K0FKEA; Manufacturer: Vishay Dale; Tolerance: 0.01; Power: 0.1W; Temperature Coefficient: ±100ppm/°C; Object  Type: Part; Design Item ID: R-30K-0603; Value: 30K; Composition: Thick Film; Features: Automotive AEC-Q200; Operating Temperature: -55°C ~ 155°C; Height - Seated (Max): 0.50mm; Category: Resistor
footprint R0603
pins: 1, 2

## R-30mR-1206
designator R?, comment Package: 1206  (hidden comment: 30mR)
RES 0.03 OHM 1% 1/4W 1206; Manufacturer Part Number: WSL1206R0300FEA; Manufacturer: Vishay Dale; Tolerance: 0.01; Power: 0.25W; Temperature Coefficient: ±75ppm/°C; Object  Type: Part; Design Item ID: R-30mR-1206; Value: 30mR; Composition: Metal Element; Features: Anti-Sulfur, Automotive AEC-Q200, Current Sense, Moisture Resistant, Pulse Withstanding; Operating Temperature: -65°C ~ 170°C; Height - Seated (Max): 0.89mm; Category: Resistor
footprint R1206
pins: 1, 2

## R-30mR-2512
designator R?, comment Package: 2512  (hidden comment: 30mR)
RES 0.03 OHM 1% 1W 2512; Manufacturer Part Number: WSL2512R0300FEA; Manufacturer: Vishay Dale; Tolerance: 0.01; Temperature Coefficient: ±75ppm/°C; Object  Type: Part; Design Item ID: R-30mR-2512; Value: 30mR; Power: 1W; Composition: Metal Element; Features: Anti-Sulfur, Automotive AEC-Q200, Current Sense, Moisture Resistant, Pulse Withstanding; Operating Temperature: -65°C ~ 170°C; Height - Seated (Max): 0.89mm; Category: Resistor
footprint R2512
pins: 1, 2

## R-30R-0402
designator R?, comment Package: 0402  (hidden comment: 30R)
RES 30 OHM 1% 1/16W 0402; Manufacturer Part Number: RC0402FR-0730RL; Manufacturer: YAGEO; Tolerance: 0.01; Power: 0.063W; Temperature Coefficient: ±100ppm/°C; Object  Type: Part; Design Item ID: R-30R-0402; Value: 30R; Composition: Thick Film; Features: Moisture Resistant; Operating Temperature: -55°C ~ 155°C; Height - Seated (Max): 0.40mm; Category: Resistor
footprint R0402
pins: 1, 2

## R-30R-0603
designator R?, comment Package: 0603  (hidden comment: 30R)
RES SMD 30 OHM 1% 1/10W 0603; Manufacturer Part Number: CRCW060330R0FKEA; Manufacturer: Vishay Dale; Tolerance: 0.01; Power: 0.1W; Temperature Coefficient: ±100ppm/°C; Object  Type: Part; Design Item ID: R-30R-0603; Value: 30R; Composition: Thick Film; Features: Automotive AEC-Q200; Operating Temperature: -55°C ~ 155°C; Height - Seated (Max): 0.50mm; Category: Resistor
footprint R0603
pins: 1, 2

## R-31.6K-0402
designator R?, comment Package: 0402  (hidden comment: 31.6K)
RES 31.6K OHM 1% 1/16W 0402; Manufacturer Part Number: RC0402FR-0731K6L; Manufacturer: YAGEO; Tolerance: 0.01; Power: 0.063W; Temperature Coefficient: ±100ppm/°C; Object  Type: Part; Design Item ID: R-31.6K-0402; Value: 31.6K; Composition: Thick Film; Features: Moisture Resistant; Operating Temperature: -55°C ~ 155°C; Height - Seated (Max): 0.40mm; Category: Resistor
footprint R0402
pins: 1, 2

## R-31.6K-0603
designator R?, comment Package: 0603  (hidden comment: 31.6K)
RES SMD 31.6K OHM 1% 1/10W 0603; Manufacturer Part Number: CRCW060331K6FKEA; Manufacturer: Vishay Dale; Tolerance: 0.01; Power: 0.1W; Temperature Coefficient: ±100ppm/°C; Object  Type: Part; Design Item ID: R-31.6K-0603; Value: 31.6K; Composition: Thick Film; Features: Automotive AEC-Q200; Operating Temperature: -55°C ~ 155°C; Height - Seated (Max): 0.50mm; Category: Resistor
footprint R0603
pins: 1, 2

## R-31.6R-0402
designator R?, comment Package: 0402  (hidden comment: 31.6R)
RES 31.6 OHM 1% 1/16W 0402; Manufacturer Part Number: RC0402FR-0731R6L; Manufacturer: YAGEO; Tolerance: 0.01; Power: 0.063W; Temperature Coefficient: ±100ppm/°C; Object  Type: Part; Design Item ID: R-31.6R-0402; Value: 31.6R; Composition: Thick Film; Features: Moisture Resistant; Operating Temperature: -55°C ~ 155°C; Height - Seated (Max): 0.40mm; Category: Resistor
footprint R0402
pins: 1, 2

## R-31.6R-0603
designator R?, comment Package: 0603  (hidden comment: 31.6R)
RES SMD 31.6 OHM 1% 1/10W 0603; Manufacturer Part Number: CRCW060331R6FKEA; Manufacturer: Vishay Dale; Tolerance: 0.01; Power: 0.1W; Temperature Coefficient: ±100ppm/°C; Object  Type: Part; Design Item ID: R-31.6R-0603; Value: 31.6R; Composition: Thick Film; Features: Automotive AEC-Q200; Operating Temperature: -55°C ~ 155°C; Height - Seated (Max): 0.50mm; Category: Resistor
footprint R0603
pins: 1, 2

## R-32.4K-0402
designator R?, comment Package: 0402  (hidden comment: 32.4K)
RES 32.4K OHM 1% 1/16W 0402; Manufacturer Part Number: RC0402FR-0732K4L; Manufacturer: YAGEO; Tolerance: 0.01; Power: 0.063W; Temperature Coefficient: ±100ppm/°C; Object  Type: Part; Design Item ID: R-32.4K-0402; Value: 32.4K; Composition: Thick Film; Features: Moisture Resistant; Operating Temperature: -55°C ~ 155°C; Height - Seated (Max): 0.40mm; Category: Resistor
footprint R0402
pins: 1, 2

## R-32.4K-0603
designator R?, comment Package: 0603  (hidden comment: 32.4K)
RES SMD 32.4K OHM 1% 1/10W 0603; Manufacturer Part Number: CRCW060332K4FKEA; Manufacturer: Vishay Dale; Tolerance: 0.01; Power: 0.1W; Temperature Coefficient: ±100ppm/°C; Object  Type: Part; Design Item ID: R-32.4K-0603; Composition: Thick Film; Features: Automotive AEC-Q200; Operating Temperature: -55°C ~ 155°C; Height - Seated (Max): 0.50mm; Category: Resistor; Value: 32.4K
footprint R0603
pins: 1, 2

## R-32.4R-0402
designator R?, comment Package: 0402  (hidden comment: 32.4R)
RES 32.4 OHM 1% 1/16W 0402; Manufacturer Part Number: RC0402FR-0732R4L; Manufacturer: YAGEO; Tolerance: 0.01; Power: 0.063W; Temperature Coefficient: ±100ppm/°C; Object  Type: Part; Design Item ID: R-32.4R-0402; Value: 32.4R; Composition: Thick Film; Features: Moisture Resistant; Operating Temperature: -55°C ~ 155°C; Height - Seated (Max): 0.40mm; Category: Resistor
footprint R0402
pins: 1, 2

## R-32.4R-0603
designator R?, comment Package: 0603  (hidden comment: 32.4R)
RES SMD 32.4 OHM 1% 1/10W 0603; Manufacturer Part Number: CRCW060332R4FKEA; Manufacturer: Vishay Dale; Tolerance: 0.01; Power: 0.1W; Temperature Coefficient: ±100ppm/°C; Object  Type: Part; Design Item ID: R-32.4R-0603; Value: 32.4R; Composition: Thick Film; Features: Automotive AEC-Q200; Operating Temperature: -55°C ~ 155°C; Height - Seated (Max): 0.50mm; Category: Resistor
footprint R0603
pins: 1, 2

## R-33.2K-0402
designator R?, comment Package: 0402  (hidden comment: 33.2K)